# Altium footprint library Toradex_Colibri.PcbLib: 75 footprints (part 4 of 5)
Each footprint in its own frame and in the unit in brackets; x right, y up, seen from the top. Pads: shape width x height; smd on the part's side, far side on the other; paste and mask are expansions set on the pad; w line width, h text height; cw(c..) or ccw(c..) is an arc to the next point about the centre after c.
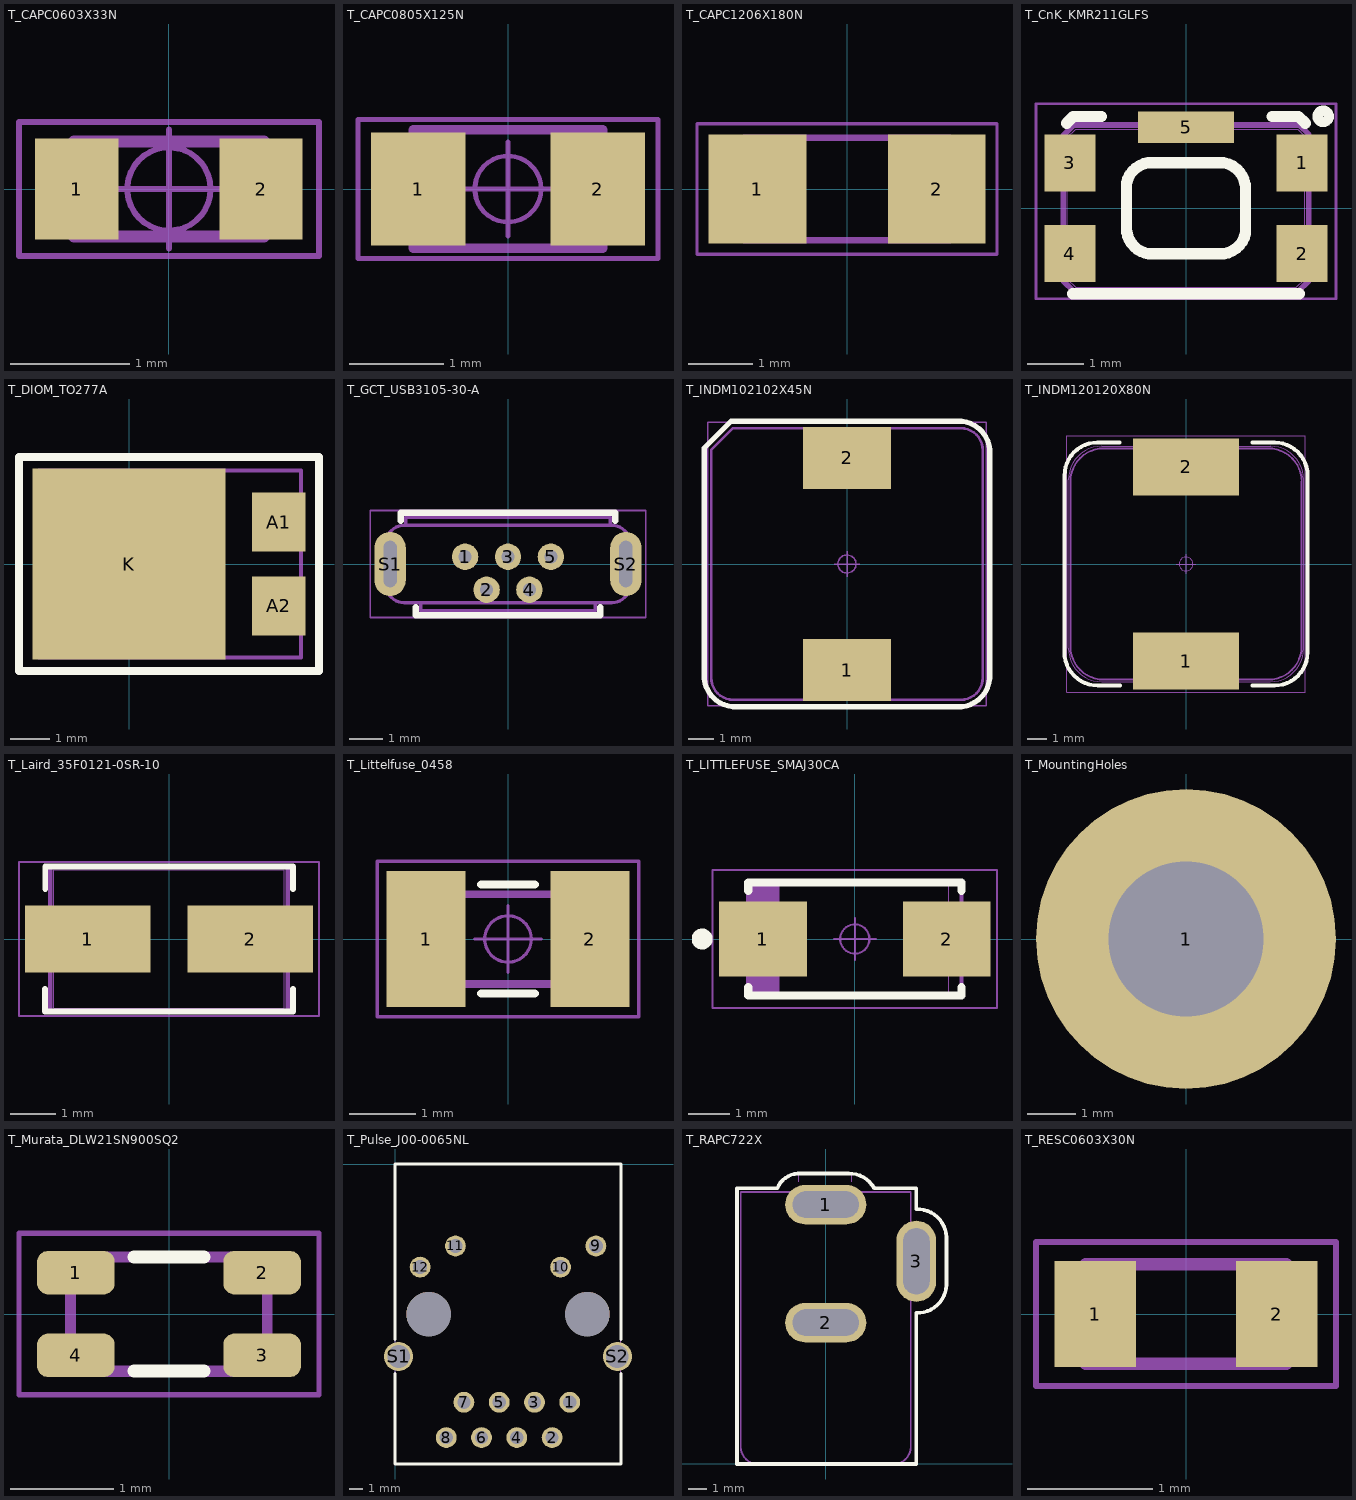
[diagram p3: the footprints below, top view; thin cyan lines are the x and y axes]

## T_CAPC0603X33N [mm] "Ceramic Capacitor 0603 (1608 metric), max height 0.9mm"
height 0.9
pads (2):
  rect 0.7x0.85 smd: 1(-0.775,0) 2(0.775,0)
Mechanical 1:
  circle w0.05: c0,0 r0.35
  lines w0.05: -0.5,0 0.5,0 ; 0,-0.5 0,0.5 ; -1.261,-0.563 1.262,-0.563 1.262,0.563 -1.261,0.563 -1.261,-0.563
Mechanical 2:
  lines w0.001: -0.8,-0.4 0.8,-0.4 0.8,0.4 -0.8,0.4 -0.8,-0.4
Mechanical 3:
  lines w0.1: -0.8,-0.4 0.8,-0.4 0.8,0.4 -0.8,0.4 -0.8,-0.4
3D body "User Library-CAPC1608X09.step": height 0.9, standoff 0, extent -0.8,-0.4 0.8,0.4

## T_CAPC0805X125N [mm] "Ceramic Capacitor 0805 (2012 metric), max height 1.25mm"
height 1.25
pads (2):
  rect 1x1.2 smd: 1(-0.95,0) 2(0.95,0)
Mechanical 1:
  circle w0.05: c0,0 r0.35
  lines w0.05: -0.5,0 0.5,0 ; 0,-0.5 0,0.5 ; -1.586,-0.736 1.586,-0.736 1.586,0.736 -1.586,0.736 -1.586,-0.736
Mechanical 2:
  lines w0.001: -1,-0.625 -1,0.625 1,0.625 1,-0.625 -1,-0.625
Mechanical 3:
  lines w0.1: -1,-0.625 1,-0.625 1,0.625 -1,0.625 -1,-0.625
3D body "User Library-CAPC2013X10.STEP": height 1, standoff 0, extent -1,-0.625 1,0.625

## T_CAPC1206X180N [mm] "Ceramic Capacitor 1206 (3216 metric), max height 1.8mm"
height 1.8
pads (2):
  rect 1.524x1.7 smd: 1(-1.397,0) 2(1.397,0)
Mechanical 1:
  lines w0.05: -2.337,-1.016 -2.337,1.016 2.336,1.016 2.336,-1.016 -2.337,-1.016
Mechanical 2:
  lines w0.01: -1.6,-0.8 1.6,-0.8 1.6,0.8 -1.6,0.8 -1.6,-0.8
Mechanical 3:
  lines w0.1: -1.6,-0.8 -1.6,0.8 1.6,0.8 1.6,-0.8 -1.6,-0.8
3D body "capacitor 1206.step": height 1, standoff 0, extent -1.6,-0.8 1.6,0.8

## T_CnK_KMR211GLFS [mm] "Microminiature Tact Switch for SMT"
height 1.9
pads (5):
  rect 0.9x1 smd: 1(2.05,0.8) 2(2.05,-0.8) 3(-2.05,0.8) 4(-2.05,-0.8)
  rect 1.7x0.55 smd: 5(0,1.43)
Top Overlay:
  circle w0.18: c2.424,1.624 r0.1
  lines w0.2: -2.109,1.502 -1.991,1.62 -1.5,1.62 ; -2,-1.51 2,-1.51 ; -1.05,-0.36 -1.05,0.44 ; -1.05,-0.35 ccw(c-0.59,-0.35) -0.662,-0.804 ; -1.05,0.444 cw(c-0.6,0.35) -0.669,0.805 ; -0.66,0.805 0.66,0.805 ; -0.655,-0.805 0.65,-0.805 ; 0.669,-0.805 ccw(c0.6,-0.35) 1.05,-0.444 ; 0.684,0.8 cw(c0.59,0.35) 1.045,0.419 ; 1.05,-0.44 1.05,0.4 ; 1.52,1.621 1.989,1.621 2.108,1.502
Mechanical 1:
  lines w0.05: -2.65,-1.6 -2.65,1.845 2.65,1.845 2.65,-1.6 -2.65,-1.6
Mechanical 2:
  lines w0.001: -2.1,-1.25 -2.1,1.25 -1.95,1.4 1.97,1.4 2.1,1.27 2.1,-1.25 1.95,-1.4 -1.95,-1.4 -2.1,-1.25
Mechanical 3:
  lines w0.1: -2.17,-1.28 -2.17,1.28 -1.98,1.47 2,1.47 2.17,1.3 2.17,-1.28 1.98,-1.47 -1.98,-1.47 -2.17,-1.28
3D body "User Library-Switch-CK-KMR2.STEP": height 2.12, standoff 0.02, extent -2.299,-1.509 2.301,1.491

## T_DIOM_TO277A [mm] "Molded Diode, 3-Leads, Body 4.75x6.65mm, IPC Medium Density"
height 1.2
pads (3):
  rect 1.35x1.5 smd: A1(3.805,1.065) A2(3.805,-1.065)
  rect 4.9x4.85 smd paste-0.5: K(0,0)
Top Overlay:
  lines w0.2: -2.794,-2.718 4.826,-2.718 4.826,2.718 -2.794,2.718 -2.794,-2.718
Mechanical 1:
  lines w0.1: -2.794,-2.718 4.826,-2.718 4.826,2.718 -2.794,2.718 -2.794,-2.718
Mechanical 2:
  lines w0.001: -2.281,-2.375 -2.281,2.375 4.369,2.375 4.369,-2.375 -2.281,-2.375
Mechanical 3:
  lines w0.1: -2.281,-2.375 4.369,-2.375 4.369,2.375 -2.281,2.375 -2.281,-2.375
3D body "User Library-TO-277A(SMPC).step": height 1.2, standoff 0, extent -2.281,-2.375 4.369,2.375

## T_GCT_USB3105-30-A [mm] "Micro USB Connector Vertical"
height 5.6
pads (7):
  round 0.8 hole 0.4: 1(-1.3,0.22) 2(-0.65,-0.78) 3(0,0.22) 4(0.65,-0.78) 5(1.3,0.22)
  oval 0.95x1.95 hole 0.4 slot 1.4 at 90 deg: S1(-3.575,0) S2(3.575,0)
Top Overlay:
  lines w0.2: -3.25,1.32 -3.25,1.55 3.25,1.55 3.25,1.32 ; -2.8,-1.32 -2.8,-1.55 2.8,-1.55 2.8,-1.32
Mechanical 1:
  lines w0.05: -4.175,-1.625 4.175,-1.625 4.175,1.625 -4.175,1.625 -4.175,-1.625
Mechanical 2:
  lines w0.001: -3.7,-0.175 -3.945,-0.175 -3.945,0.625 -3.7,0.625 ; -3.1,1.175 -3.1,1.42 3.1,1.42 3.1,1.175 ; -2.65,-1.175 -2.65,-1.42 2.65,-1.42 2.65,-1.175 ; 3.15,1.175 cw(c3.15,0.625) 3.7,0.625 ; 3.175,1.175 -3.15,1.175 ccw(c-3.15,0.625) -3.7,0.625 ; 3.7,-0.175 3.945,-0.175 3.945,0.625 3.7,0.625 ; -3.7,0.625 -3.7,-0.625 ccw(c-3.15,-0.625) -3.15,-1.175 3.15,-1.175 ccw(c3.15,-0.625) 3.7,-0.625 3.7,0.625
Mechanical 3:
  lines w0.1: -3.7,-0.175 -3.945,-0.175 -3.945,0.625 -3.7,0.625 ; -3.1,1.175 -3.1,1.42 3.1,1.42 3.1,1.175 ; -2.65,-1.175 -2.65,-1.42 2.65,-1.42 2.65,-1.175 ; 3.15,1.175 cw(c3.15,0.625) 3.7,0.625 ; 3.175,1.175 -3.15,1.175 ccw(c-3.15,0.625) -3.7,0.625 ; 3.7,-0.175 3.945,-0.175 3.945,0.625 3.7,0.625 ; -3.7,0.625 -3.7,-0.625 ccw(c-3.15,-0.625) -3.15,-1.175 3.15,-1.175 ccw(c3.15,-0.625) 3.7,-0.625 3.7,0.625
3D body "USB3105.STEP": height 5.62, standoff -1.48, extent -3.98,-1.455 3.98,1.48

## T_INDM102102X45N [mm]
height 4.5
pads (2):
  rect 3.4x2.4 smd: 1(0,-4.1) 2(0,4.1)
Top Overlay:
  lines w0.2: 4.24,-5.52 ccw(c4.32,-4.32) 5.52,-4.4 5.52,4.4 ; 4.4,-5.52 -4.4,-5.52 cw(c-4.32,-4.32) -5.52,-4.24 -5.52,4.49 -4.49,5.52 4.24,5.52 cw(c4.32,4.32) 5.52,4.24
Mechanical 1:
  circle w0.05: c0,0 r0.35
  lines w0.05: -0.5,0 0.5,0 ; 0,-0.5 0,0.5 ; -5.38,-5.48 -5.38,5.48 5.38,5.48 5.38,-5.48 -5.38,-5.48
Mechanical 2:
  lines w0.001: -5.25,-4.4 ccw(c-4.4,-4.4) -4.4,-5.25 4.4,-5.25 ccw(c4.4,-4.4) 5.25,-4.4 5.25,4.4 ccw(c4.4,4.4) 4.4,5.25 -4.4,5.25 -5.25,4.4 -5.25,-4.4
Mechanical 3:
  lines w0.1: -5.25,-4.4 ccw(c-4.4,-4.4) -4.4,-5.25 4.4,-5.25 ccw(c4.4,-4.4) 5.25,-4.4 5.25,4.4 ccw(c4.4,4.4) 4.4,5.25 -4.4,5.25 -5.25,4.4 -5.25,-4.4
3D body: height 4.5, standoff 0, extent -5.25,-5.25 5.25,5.25

## T_INDM120120X80N [mm]
height 6
pads (2):
  rect 5.4x2.9 smd: 1(0,-4.95) 2(0,4.95)
Top Overlay:
  lines w0.2: -6.204,-4.492 ccw(c-4.496,-4.492) -4.496,-6.2 -3.373,-6.2 ; -6.2,-4.492 -6.2,4.516 ; -6.196,4.516 cw(c-4.513,4.516) -4.513,6.2 -3.39,6.2 ; 3.382,-6.2 4.505,-6.2 ccw(c4.505,-4.509) 6.196,-4.509 ; 3.393,6.196 4.516,6.196 cw(c4.516,4.512) 6.2,4.512 6.2,-4.509
Mechanical 1:
  circle w0.05: c0,0 r0.35
  lines w0.05: -0.5,0 0.5,0 ; 0,-0.5 0,0.5 ; -6.08,-6.535 -6.08,6.535 6.08,6.535 6.08,-6.535 -6.08,-6.535
Mechanical 2:
  lines w0.001: -6,-4.299 ccw(c-4.299,-4.299) -4.3,-6 ; -6,4.3 cw(c-4.299,4.299) -4.299,6 ; -6,-4.302 -6,4.303 ; -4.303,6 4.322,6 ; -4.302,-6 4.304,-6 ; 4.299,-6 ccw(c4.299,-4.299) 6,-4.3 ; 4.3,6 cw(c4.299,4.299) 6,4.299 ; 6,-4.313 6,4.322
Mechanical 3:
  lines w0.1: -5.901,-4.198 ccw(c-4.2,-4.198) -4.201,-5.899 ; -5.9,-4.21 -5.9,4.2 ; -5.899,4.201 cw(c-4.198,4.2) -4.198,5.901 ; -4.21,-5.9 4.21,-5.9 ; -4.2,5.9 4.2,5.9 ; 4.198,-5.901 ccw(c4.198,-4.2) 5.899,-4.201 ; 4.201,5.899 cw(c4.2,4.198) 5.901,4.198 ; 5.9,-4.21 5.9,4.2
3D body: height 6, standoff 0, extent -6,-6 6,6

## T_Laird_35F0121-0SR-10 [mm] "Power supply FB 10A"
height 3.05
pads (2):
  rect 2.77x1.47 smd: 1(-1.79,0) 2(1.79,0)
Top Overlay:
  lines w0.127: -2.732,-1.102 -2.732,-1.599 2.73,-1.599 2.73,-1.104 ; -2.729,1.104 -2.729,1.599 2.73,1.599 2.73,1.104
Mechanical 1:
  lines w0.05: -3.306,-1.695 3.305,-1.695 3.305,1.695 -3.306,1.695 -3.306,-1.695
Mechanical 2:
  lines w0.001: -2.54,-1.525 2.54,-1.525 2.54,1.525 -2.54,1.525 -2.54,-1.525
Mechanical 3:
  lines w0.1: -2.614,-1.599 -2.614,1.599 2.614,1.599 2.614,-1.599 -2.614,-1.599
3D body: height 3.05, standoff 0, extent -2.54,-1.525 2.54,1.525

## T_Littelfuse_0458 [mm] "Fast Fuse"
height 1.575
pads (2):
  rect 1.185x2.05 smd: 1(-1.232,0) 2(1.232,0)
Top Overlay:
  lines w0.127: -0.4,-0.82 0.4,-0.82 ; -0.4,0.82 0.4,0.82
Mechanical 1:
  circle w0.05: c0,0 r0.35
  lines w0.05: -0.5,0 0.5,0 ; 0,-0.5 0,0.5 ; -1.97,-1.17 1.97,-1.17 1.97,1.17 -1.97,1.17 -1.97,-1.17
Mechanical 2:
  lines w0.005: -1.587,-0.725 1.587,-0.725 1.587,0.725 -1.587,0.725 -1.587,-0.725
Mechanical 3:
  lines w0.1: -1.53,-0.67 1.53,-0.67 1.53,0.67 -1.53,0.67 -1.53,-0.67
3D body "User Library-Fast Acting Surface-Mount Fuses (1).step": height 1.1, standoff 0, extent -1.51,-0.801 1.51,0.801

## T_LITTLEFUSE_SMAJ30CA [mm] "Bidirectional ESD protection"
height 2.29
pads (2):
  rect 2.1x1.8 smd: 1(-2.2,0) 2(2.2,0)
Top Overlay:
  circle w0.25: c-3.65,0 r0.125
  lines w0.2: -2.55,-1.15 -2.55,-1.35 2.55,-1.35 2.55,-1.15 ; -2.55,1.15 -2.55,1.35 2.55,1.35 2.55,1.15
Mechanical 1:
  circle w0.05: c0,0 r0.35
  lines w0.05: -0.5,0 0.5,0 ; 0,-0.5 0,0.5 ; -3.4,-1.65 -3.4,1.65 3.4,1.65 3.4,-1.65 -3.4,-1.65
Mechanical 2:
  lines w0.001: -2.25,-1.395 -2.25,1.395 2.25,1.395 2.25,-1.395 -2.25,-1.395
Mechanical 3:
  lines w0.1: -2.452,-1.332 -2.452,1.332 ; -2.352,-1.332 -2.352,1.332 ; -2.252,-1.332 -2.252,1.332 ; -2.152,-1.332 -2.152,1.332 ; -2.052,-1.332 -2.052,1.332 ; -1.952,-1.332 -1.952,1.332 ; -1.852,-1.332 -1.852,1.332 ; -2.552,-1.332 -2.552,1.332 ; -2.552,-1.332 -2.552,1.332 ; -2.552,-1.332 2.552,-1.332 2.552,1.332 -2.552,1.332
3D body: height 2.29, standoff 0, extent -2.25,-1.395 2.25,1.395

## T_MountingHoles [mm] "PCB Mounting Holes"
pads (1):
  round 6.2 hole 3.2: 1(0,0)

## T_Murata_DLW21SN900SQ2 [mm] "Common Mode Choke"
height 1.2
pads (4):
  rrect50% 0.75x0.42 smd: 1(-0.9,0.4) 2(0.9,0.4) 3(0.9,-0.4) 4(-0.9,-0.4)
Top Overlay:
  lines w0.127: -0.34,-0.55 0.34,-0.55 ; -0.34,0.55 0.34,0.55
Mechanical 1:
  lines w0.05: -1.45,-0.78 -1.45,0.78 1.45,0.78 1.45,-0.78 -1.45,-0.78
Mechanical 2:
  lines w0.001: -1,-0.6 -1,0.6 1,0.6 1,-0.6 -1,-0.6
Mechanical 3:
  lines w0.1: -0.95,-0.55 -0.95,0.55 0.95,0.55 0.95,-0.55 -0.95,-0.55
3D body: height 1.2, standoff 0, extent -1,-0.6 1,0.6

## T_Pulse_J00-0065NL [mm] "RJ45 Connector"
height 13.84
pads (16):
  round 1.5 hole 0.95: 1(12.575,-17.15) 2(11.305,-19.69) 3(10.035,-17.15) 4(8.765,-19.69) 5(7.495,-17.15) 6(6.225,-19.69) 7(4.955,-17.15) 8(3.685,-19.69)
  round 1.5 hole 1.02: 9(14.455,-5.9) 10(11.915,-7.42) 11(4.345,-5.9) 12(1.805,-7.42)
  round 2.1 hole 1.63: S1(0.255,-13.85) S2(16.005,-13.85)
  round 3.2 hole 3.2 unplated: ""(2.415,-10.8) ""(13.845,-10.8)
Top Overlay:
  lines w0.2: 0,-15.086 0,-21.59 16.26,-21.59 16.26,-15.086 ; 0,-12.621 0,0 ; 16.26,-12.621 16.26,0 ; 0,0 16.26,0 ; 0,0 0,0 ; 16.26,0 16.26,0
Mechanical 1:
  lines w0.05: 0,-15.328 0,-21.59 16.26,-21.59 16.26,-15.328 ; 0,-12.626 0,0 16.26,0 16.26,-12.626
Mechanical 2:
  lines w0.001: 0,-21.59 0,0 16.26,0 16.26,-21.59 0,-21.59
Mechanical 3:
  lines w0.1: 0,-15.039 0,-21.59 16.26,-21.59 16.26,-15.039 ; 0,-12.612 0,0 16.26,0 16.26,-12.612
3D body "7499010211A.stp": height 13.32, standoff -3.23, extent 0.19,-21.75 16.07,0.09

## T_RAPC722X [mm] "Connector, 2.1mm (Dia), 5.5mm(Dia), Round Power Socket"
height 10.7
pads (3):
  oval 4.3x2.1 hole 1.4 slot 3.5 at 0 deg: 1(0,13.74) 2(0,7.49)
  oval 2.1x4.3 hole 1.4 slot 3.5 at 90 deg: 3(4.8,10.74)
Top Overlay:
  lines w0.2: 1.196,15.393 -1.3,15.393 ccw(c-1.385,14.115) -2.569,14.6 -4.7,14.6 -4.7,0 4.79,0 4.79,8 ccw(c4.843,9.553) 6.396,9.499 6.396,11.996 ccw(c4.841,11.945) 4.79,13.5 4.79,14.59 4.78,14.6 2.569,14.6 ccw(c1.234,13.866) 1.2,15.388
Mechanical 1:
  lines w0.05: -1.332,15.393 1.164,15.393 ; -1.332,15.394 ccw(c-1.384,14.115) -2.568,14.6 -4.7,14.6 -4.7,0 4.8,0 4.8,8 ccw(c4.843,9.553) 6.396,9.499 6.396,11.996 ccw(c4.841,11.945) 4.8,13.5 4.8,14.6 2.568,14.6 ; 1.169,15.388 cw(c1.203,13.866) 2.537,14.6
Mechanical 2:
  lines w0.001: -1.432,14.95 -1.432,15.4 ; -1.4,13.95 -1.4,14.4 -4.5,14.4 -4.5,0.9 ccw(c-3.6,0.9) -3.6,0 3.6,0 ; 1.368,14.95 1.368,15.4 ; 1.4,13.95 1.4,14.4 4.5,14.4 4.5,0.9 cw(c3.6,0.9) 3.6,0
Mechanical 3:
  lines w0.1: -4.5,0.9 ccw(c-3.6,0.9) -3.6,0 3.6,0 ccw(c3.6,0.9) 4.5,0.9 4.5,14.4 -4.5,14.4 -4.5,0.9
3D body: height 10.7, standoff 0, extent -4.5,0 4.5,14.4
3D body: height 4, standoff -3.7, extent 4.5,9.45 4.7,11.85
3D body: height 4, standoff -3.7, extent -1.2,7.55 1.2,7.75
3D body: height 4, standoff -3.7, extent -1.4,13.55 1.4,13.75
3D body: height 9.59, standoff 3.21, extent -3.2,0 3.175,2
3D body: height 7.4, standoff 5.4, extent -1,0 0.992,2

## T_RESC0603X30N [mm] "Film Resistor 0603 (1608 metric), max height 0.45mm"
height 0.45
pads (2):
  rect 0.65x0.85 smd: 1(-0.725,0) 2(0.725,0)
Mechanical 1:
  lines w0.05: -1.2,-0.575 -1.2,0.575 1.2,0.575 1.2,-0.575 -1.2,-0.575
Mechanical 2:
  lines w0.001: -0.8,-0.4 -0.8,0.4 0.8,0.4 0.8,-0.4 -0.8,-0.4
Mechanical 3:
  lines w0.1: -0.8,-0.4 -0.8,0.4 0.8,0.4 0.8,-0.4 -0.8,-0.4
3D body "User Library-RES_1609-0603.step": height 0.56, standoff 0, extent -0.85,-0.4 0.85,0.4